# Altium footprint library 20210518.PcbLib: 414 footprints (part 13 of 26)
Each footprint in its own frame and in the unit in brackets; x right, y up, seen from the top. Pads: shape width x height; smd on the part's side, far side on the other; paste and mask are expansions set on the pad; w line width, h text height; cw(c..) or ccw(c..) is an arc to the next point about the centre after c.
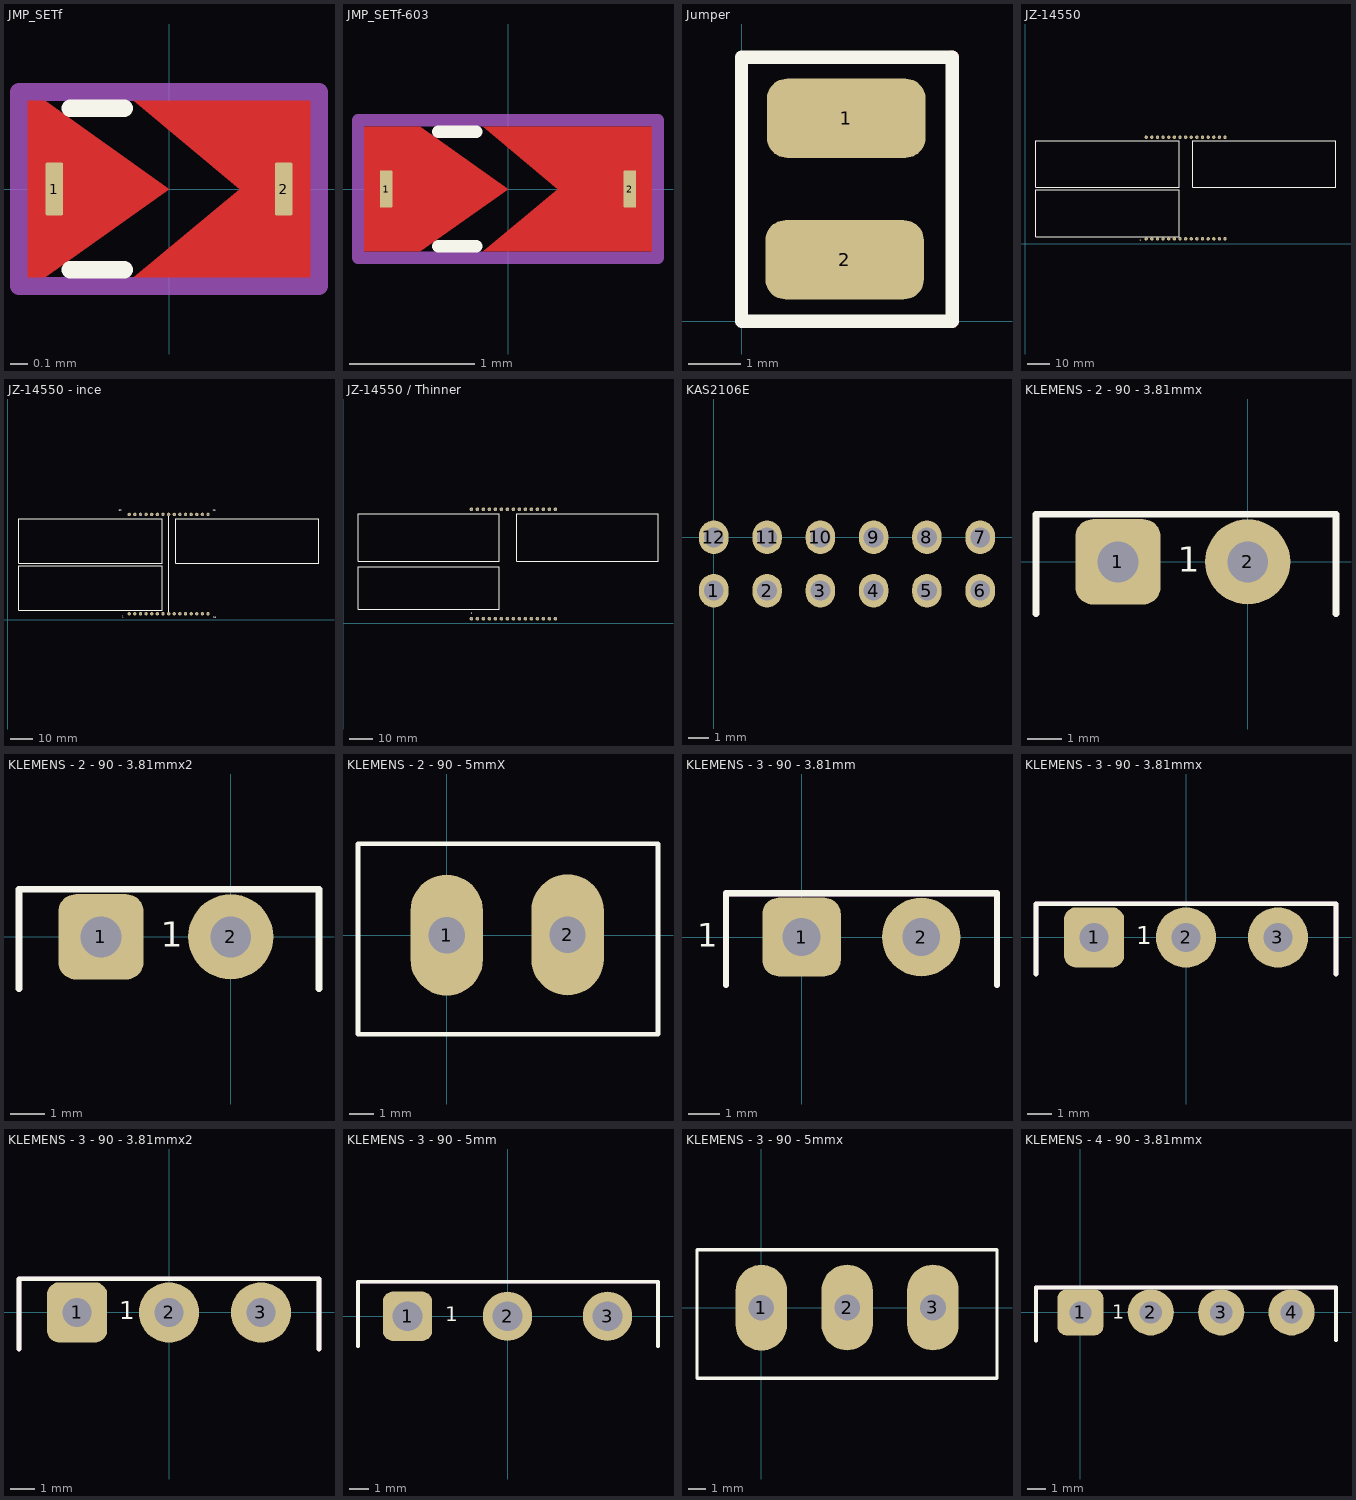
[diagram p12: the footprints below, top view; thin cyan lines are the x and y axes]

## JMP_SETf [mm] "Jumper 2pin; setting jumper"
pads (2):
  rrect20% 0.1x0.3 smd: 1(-0.65,0) 2(0.65,0)
Top Layer:
  region: -0.8,0.5 -0.8,-0.5 -0.7,-0.5 0,0 -0.7,0.5
  region: -0.2,0.5 0.8,0.5 0.8,-0.5 -0.2,-0.5 0.4,0
Top Overlay:
  lines w0.1: -0.559,-0.457 -0.254,-0.457 ; -0.559,0.457 -0.254,0.457
Top Solder:
  region: -0.2,0.5 0.8,0.5 0.8,-0.5 -0.2,-0.5 0.4,0
  region: -0.8,0.5 -0.8,-0.5 -0.7,-0.5 0,0 -0.7,0.5
Mechanical 13:
  lines w0.1: -0.85,-0.55 0.85,-0.55 0.85,0.55 -0.85,0.55 -0.85,-0.55
Mechanical 15:
  lines w0.1: -0.85,-0.55 0.85,-0.55 0.85,0.55 -0.85,0.55 -0.85,-0.55

## JMP_SETf-603 [mm] "Jumper 2pin; setting jumper"
pads (2):
  rrect20% 0.1x0.3 smd: 1(-0.975,0) 2(0.975,0)
Top Layer:
  region: -1.15,0.5 -1.15,-0.5 -0.7,-0.5 0,0 -0.7,0.5
  region: -0.2,0.5 1.15,0.5 1.15,-0.5 -0.2,-0.5 0.4,0
Top Overlay:
  lines w0.1: -0.559,-0.457 -0.254,-0.457 ; -0.559,0.457 -0.254,0.457
Top Solder:
  region: -0.2,0.5 1.15,0.5 1.15,-0.5 -0.2,-0.5 0.4,0
  region: -1.15,0.5 -1.15,-0.5 -0.7,-0.5 0,0 -0.7,0.5
Mechanical 13:
  lines w0.1: -1.2,-0.55 1.2,-0.55 1.2,0.55 -1.2,0.55 -1.2,-0.55
Mechanical 15:
  lines w0.1: -1.2,-0.55 1.194,-0.55 1.194,0.55 -1.2,0.55 -1.2,-0.55

## Jumper [mm]
pads (2):
  rrect50% 3x1.5 smd: 1(1.981,3.844) 2(1.951,1.163)
Top Layer:
  lines w0.254: 3.988,0.001 3.99,0.003 ; 3.99,4.998 3.992,5
Top Overlay:
  lines w0.254: -0.002,0.014 -0.002,5.001 ; 0,0.001 3.988,0.001 ; 0.017,5 3.992,5 ; 3.99,0.003 3.99,4.998

## JZ-14550 [mm]
pads (30):
  round 1.524 hole 0.8: 1(54.5,2.25) 2(57.04,2.25) 3(59.58,2.25) 4(62.12,2.25) 5(64.66,2.25) 6(67.2,2.25) 7(69.74,2.25) 8(72.28,2.25) 9(74.82,2.25) 10(77.36,2.25) 11(79.9,2.25) 12(82.44,2.25) 13(84.98,2.25) 14(87.52,2.25) 15(90.06,2.25) 16(90.06,48.05) 17(87.52,48.05) 18(84.98,48.05) 19(82.44,48.05) 20(79.9,48.05) 21(77.36,48.05) 22(74.82,48.05) 23(72.28,48.05) 24(69.74,48.05) 25(67.2,48.05) 26(64.66,48.05) 27(62.12,48.05) 28(59.58,48.05) 29(57.04,48.05) 30(54.5,48.05)
Top Overlay:
  lines w0.254: 4.8,3.2 69.5,3.2 69.5,24.3 4.8,24.3 4.8,3.2 ; 4.8,25.45 4.8,46.5 69.5,46.5 69.5,25.45 4.8,25.45 ; 75.4,25.4 140.1,25.4 140.1,46.5 75.4,46.5 75.4,25.4
  text "1" at 51.65,0.6 h1.52
3D body: height 17.01, standoff 17, extent 7.65,21.75 16.65,22.75
3D body: height 17.01, standoff 17, extent 15.65,13.75 16.65,22.75
3D body: height 17.01, standoff 17, extent 7.65,13.75 16.65,14.75
3D body: height 17.01, standoff 17, extent 7.65,13.75 8.65,22.75
3D body: height 17.01, standoff 17, extent 7.65,12.75 16.65,13.75
3D body: height 17.01, standoff 17, extent 15.65,4.75 16.65,13.75
3D body: height 17.01, standoff 17, extent 7.65,4.75 16.65,5.75
3D body: height 17.01, standoff 17, extent 7.65,4.75 8.65,13.75
3D body: height 17.01, standoff 17, extent 17.65,4.75 18.65,13.75
3D body: height 17.01, standoff 17, extent 17.65,4.75 26.65,5.75
3D body: height 17.01, standoff 17, extent 25.65,4.75 26.65,13.75
3D body: height 17.01, standoff 17, extent 17.65,12.75 26.65,13.75
3D body: height 17.01, standoff 17, extent 17.65,13.75 18.65,22.75
3D body: height 17.01, standoff 17, extent 17.65,13.75 26.65,14.75
3D body: height 17.01, standoff 17, extent 25.65,13.75 26.65,22.75
3D body: height 17.01, standoff 17, extent 17.65,21.75 26.65,22.75
3D body: height 17.01, standoff 17, extent 27.65,4.75 28.65,13.75
3D body: height 17.01, standoff 17, extent 27.65,4.75 36.65,5.75
3D body: height 17.01, standoff 17, extent 35.65,4.75 36.65,13.75
3D body: height 17.01, standoff 17, extent 27.65,12.75 36.65,13.75
3D body: height 17.01, standoff 17, extent 27.65,13.75 28.65,22.75
3D body: height 17.01, standoff 17, extent 27.65,13.75 36.65,14.75
3D body: height 17.01, standoff 17, extent 35.65,13.75 36.65,22.75
3D body: height 17.01, standoff 17, extent 27.65,21.75 36.65,22.75
3D body: height 17.01, standoff 17, extent 37.65,4.75 38.65,13.75
3D body: height 17.01, standoff 17, extent 37.65,4.75 46.65,5.75
3D body: height 17.01, standoff 17, extent 45.65,4.75 46.65,13.75
3D body: height 17.01, standoff 17, extent 37.65,12.75 46.65,13.75
3D body: height 17.01, standoff 17, extent 37.65,13.75 38.65,22.75
3D body: height 17.01, standoff 17, extent 37.65,13.75 46.65,14.75
3D body: height 17.01, standoff 17, extent 45.65,13.75 46.65,22.75
3D body: height 17.01, standoff 17, extent 37.65,21.75 46.65,22.75
3D body: height 17.01, standoff 17, extent 47.65,4.75 48.65,13.75
3D body: height 17.01, standoff 17, extent 47.65,4.75 56.65,5.75
3D body: height 17.01, standoff 17, extent 55.65,4.75 56.65,13.75
3D body: height 17.01, standoff 17, extent 47.65,12.75 56.65,13.75
3D body: height 17.01, standoff 17, extent 47.65,13.75 48.65,22.75
3D body: height 17.01, standoff 17, extent 47.65,13.75 56.65,14.75
3D body: height 17.01, standoff 17, extent 55.65,13.75 56.65,22.75
3D body: height 17.01, standoff 17, extent 47.65,21.75 56.65,22.75
3D body: height 17.01, standoff 17, extent 57.65,4.75 58.65,13.75
3D body: height 17.01, standoff 17, extent 57.65,4.75 66.65,5.75
3D body: height 17.01, standoff 17, extent 65.65,4.75 66.65,13.75
3D body: height 17.01, standoff 17, extent 57.65,12.75 66.65,13.75
3D body: height 17.01, standoff 17, extent 57.65,13.75 58.65,22.75
3D body: height 17.01, standoff 17, extent 57.65,13.75 66.65,14.75
3D body: height 17.01, standoff 17, extent 65.65,13.75 66.65,22.75
3D body: height 17.01, standoff 17, extent 57.65,21.75 66.65,22.75
3D body: height 17.01, standoff 17, extent 78.25,43.95 87.25,44.95
3D body: height 17.01, standoff 17, extent 86.25,35.95 87.25,44.95
3D body: height 17.01, standoff 17, extent 78.25,35.95 87.25,36.95
3D body: height 17.01, standoff 17, extent 78.25,35.95 79.25,44.95
3D body: height 17.01, standoff 17, extent 78.25,34.95 87.25,35.95
3D body: height 17.01, standoff 17, extent 86.25,26.95 87.25,35.95
3D body: height 17.01, standoff 17, extent 78.25,26.95 87.25,27.95
3D body: height 17.01, standoff 17, extent 78.25,26.95 79.25,35.95
3D body: height 17.01, standoff 17, extent 88.25,26.95 89.25,35.95
3D body: height 17.01, standoff 17, extent 88.25,26.95 97.25,27.95
3D body: height 17.01, standoff 17, extent 96.25,26.95 97.25,35.95
3D body: height 17.01, standoff 17, extent 88.25,34.95 97.25,35.95
3D body: height 17.01, standoff 17, extent 88.25,35.95 89.25,44.95
3D body: height 17.01, standoff 17, extent 88.25,35.95 97.25,36.95
3D body: height 17.01, standoff 17, extent 96.25,35.95 97.25,44.95
3D body: height 17.01, standoff 17, extent 88.25,43.95 97.25,44.95
3D body: height 17.01, standoff 17, extent 98.25,26.95 99.25,35.95
3D body: height 17.01, standoff 17, extent 98.25,26.95 107.25,27.95
3D body: height 17.01, standoff 17, extent 106.25,26.95 107.25,35.95
3D body: height 17.01, standoff 17, extent 98.25,34.95 107.25,35.95
3D body: height 17.01, standoff 17, extent 98.25,35.95 99.25,44.95
3D body: height 17.01, standoff 17, extent 98.25,35.95 107.25,36.95
3D body: height 17.01, standoff 17, extent 106.25,35.95 107.25,44.95
3D body: height 17.01, standoff 17, extent 98.25,43.95 107.25,44.95
3D body: height 17.01, standoff 17, extent 108.25,26.95 109.25,35.95
3D body: height 17.01, standoff 17, extent 108.25,26.95 117.25,27.95
3D body: height 17.01, standoff 17, extent 116.25,26.95 117.25,35.95
3D body: height 17.01, standoff 17, extent 108.25,34.95 117.25,35.95
3D body: height 17.01, standoff 17, extent 108.25,35.95 109.25,44.95
3D body: height 17.01, standoff 17, extent 108.25,35.95 117.25,36.95
3D body: height 17.01, standoff 17, extent 116.25,35.95 117.25,44.95
3D body: height 17.01, standoff 17, extent 108.25,43.95 117.25,44.95
3D body: height 17.01, standoff 17, extent 118.25,26.95 119.25,35.95
3D body: height 17.01, standoff 17, extent 118.25,26.95 127.25,27.95
3D body: height 17.01, standoff 17, extent 126.25,26.95 127.25,35.95
3D body: height 17.01, standoff 17, extent 118.25,34.95 127.25,35.95
3D body: height 17.01, standoff 17, extent 118.25,35.95 119.25,44.95
3D body: height 17.01, standoff 17, extent 118.25,35.95 127.25,36.95
3D body: height 17.01, standoff 17, extent 126.25,35.95 127.25,44.95
3D body: height 17.01, standoff 17, extent 118.25,43.95 127.25,44.95
3D body: height 17.01, standoff 17, extent 128.25,26.95 129.25,35.95
3D body: height 17.01, standoff 17, extent 128.25,26.95 137.25,27.95
3D body: height 17.01, standoff 17, extent 136.25,26.95 137.25,35.95
3D body: height 17.01, standoff 17, extent 128.25,34.95 137.25,35.95
3D body: height 17.01, standoff 17, extent 128.25,35.95 129.25,44.95
3D body: height 17.01, standoff 17, extent 128.25,35.95 137.25,36.95
3D body: height 17.01, standoff 17, extent 136.25,35.95 137.25,44.95
3D body: height 17.01, standoff 17, extent 128.25,43.95 137.25,44.95
3D body: height 17.01, standoff 17, extent 57.65,43.95 66.65,44.95
3D body: height 17.01, standoff 17, extent 65.65,35.95 66.65,44.95
3D body: height 17.01, standoff 17, extent 57.65,35.95 66.65,36.95
3D body: height 17.01, standoff 17, extent 57.65,35.95 58.65,44.95
3D body: height 17.01, standoff 17, extent 57.65,34.95 66.65,35.95
3D body: height 17.01, standoff 17, extent 65.65,26.95 66.65,35.95
3D body: height 17.01, standoff 17, extent 57.65,26.95 66.65,27.95
3D body: height 17.01, standoff 17, extent 57.65,26.95 58.65,35.95
3D body: height 17.01, standoff 17, extent 47.65,43.95 56.65,44.95
3D body: height 17.01, standoff 17, extent 55.65,35.95 56.65,44.95
3D body: height 17.01, standoff 17, extent 47.65,35.95 56.65,36.95
3D body: height 17.01, standoff 17, extent 47.65,35.95 48.65,44.95
3D body: height 17.01, standoff 17, extent 47.65,34.95 56.65,35.95
3D body: height 17.01, standoff 17, extent 55.65,26.95 56.65,35.95
3D body: height 17.01, standoff 17, extent 47.65,26.95 56.65,27.95
3D body: height 17.01, standoff 17, extent 47.65,26.95 48.65,35.95
3D body: height 17.01, standoff 17, extent 37.65,43.95 46.65,44.95
3D body: height 17.01, standoff 17, extent 45.65,35.95 46.65,44.95
3D body: height 17.01, standoff 17, extent 37.65,35.95 46.65,36.95
3D body: height 17.01, standoff 17, extent 37.65,35.95 38.65,44.95
3D body: height 17.01, standoff 17, extent 37.65,34.95 46.65,35.95
3D body: height 17.01, standoff 17, extent 45.65,26.95 46.65,35.95
3D body: height 17.01, standoff 17, extent 37.65,26.95 46.65,27.95
3D body: height 17.01, standoff 17, extent 37.65,26.95 38.65,35.95
3D body: height 17.01, standoff 17, extent 27.65,43.95 36.65,44.95
3D body: height 17.01, standoff 17, extent 35.65,35.95 36.65,44.95
3D body: height 17.01, standoff 17, extent 27.65,35.95 36.65,36.95
3D body: height 17.01, standoff 17, extent 27.65,35.95 28.65,44.95
3D body: height 17.01, standoff 17, extent 27.65,34.95 36.65,35.95
3D body: height 17.01, standoff 17, extent 35.65,26.95 36.65,35.95
3D body: height 17.01, standoff 17, extent 27.65,26.95 36.65,27.95
3D body: height 17.01, standoff 17, extent 27.65,26.95 28.65,35.95
3D body: height 17.01, standoff 17, extent 17.65,43.95 26.65,44.95
3D body: height 17.01, standoff 17, extent 25.65,35.95 26.65,44.95
3D body: height 17.01, standoff 17, extent 17.65,35.95 26.65,36.95
3D body: height 17.01, standoff 17, extent 17.65,35.95 18.65,44.95
3D body: height 17.01, standoff 17, extent 17.65,34.95 26.65,35.95
3D body: height 17.01, standoff 17, extent 25.65,26.95 26.65,35.95
3D body: height 17.01, standoff 17, extent 17.65,26.95 26.65,27.95
3D body: height 17.01, standoff 17, extent 17.65,26.95 18.65,35.95
3D body: height 17.01, standoff 17, extent 7.65,26.95 8.65,35.95
3D body: height 17.01, standoff 17, extent 7.65,26.95 16.65,27.95
3D body: height 17.01, standoff 17, extent 15.65,26.95 16.65,35.95
3D body: height 17.01, standoff 17, extent 7.65,34.95 16.65,35.95
3D body: height 17.01, standoff 17, extent 7.65,35.95 8.65,44.95
3D body: height 17.01, standoff 17, extent 7.65,35.95 16.65,36.95
3D body: height 17.01, standoff 17, extent 15.65,35.95 16.65,44.95
3D body: height 2, standoff 0, extent 0,0 2.5,50
3D body: height 2, standoff 0, extent 142.5,0 145,50
3D body: height 17.01, standoff 17, extent 7.65,43.95 16.65,44.95
3D body: height 17, standoff 2, extent 0,0 145,50

## JZ-14550 - ince [mm]
pads (30):
  round 1.524 hole 0.8: 1(54.72,2.6) 2(57.26,2.6) 3(59.8,2.6) 4(62.34,2.6) 5(64.88,2.6) 6(67.42,2.6) 7(69.96,2.6) 8(72.5,2.6) 9(75.04,2.6) 10(77.58,2.6) 11(80.12,2.6) 12(82.66,2.6) 13(85.2,2.6) 14(87.74,2.6) 15(90.28,2.6) 16(90.28,47.4) 17(87.74,47.4) 18(85.2,47.4) 19(82.66,47.4) 20(80.12,47.4) 21(77.58,47.4) 22(75.04,47.4) 23(72.5,47.4) 24(69.96,47.4) 25(67.42,47.4) 26(64.88,47.4) 27(62.34,47.4) 28(59.8,47.4) 29(57.26,47.4) 30(54.72,47.4)
Top Overlay:
  lines w0.1: 72.5,2.6 72.5,47.4
  lines w0.254: 140.32,45.4 140.32,25.4 75.62,25.4 75.62,45.45 140.32,45.45 ; 5.02,4.25 5.02,24.3 69.72,24.3 69.72,4.25 5.02,4.25 ; 5.02,25.45 69.72,25.45 69.72,45.45 5.02,45.45 5.02,25.45
  text "1" at 51.57,0.25 h1.52
  text "15" at 92.67,0.15 h1.52
  text "16" at 92.42,48.3 h1.52
  text "30" at 49.97,48.4 h1.52
3D body: height 2, standoff 0, extent 141.25,0 145,3.75
3D body: height 2, standoff 0, extent 141.25,46.25 145,50
3D body: height 2, standoff 0, extent 0,46.25 3.75,50
3D body: height 2, standoff 0, extent 0,0 3.75,3.75
3D body: height 9.26, standoff 9.25, extent 7.87,43.95 16.87,44.95
3D body: height 9.26, standoff 9.25, extent 15.87,35.95 16.87,44.95
3D body: height 9.26, standoff 9.25, extent 7.87,35.95 16.87,36.95
3D body: height 9.26, standoff 9.25, extent 7.87,35.95 8.87,44.95
3D body: height 9.26, standoff 9.25, extent 7.87,34.95 16.87,35.95
3D body: height 9.26, standoff 9.25, extent 15.87,26.95 16.87,35.95
3D body: height 9.26, standoff 9.25, extent 7.87,26.95 16.87,27.95
3D body: height 9.26, standoff 9.25, extent 7.87,26.95 8.87,35.95
3D body: height 9.26, standoff 9.25, extent 17.87,26.95 18.87,35.95
3D body: height 9.26, standoff 9.25, extent 17.87,26.95 26.87,27.95
3D body: height 9.26, standoff 9.25, extent 25.87,26.95 26.87,35.95
3D body: height 9.26, standoff 9.25, extent 17.87,34.95 26.87,35.95
3D body: height 9.26, standoff 9.25, extent 17.87,35.95 18.87,44.95
3D body: height 9.26, standoff 9.25, extent 17.87,35.95 26.87,36.95
3D body: height 9.26, standoff 9.25, extent 25.87,35.95 26.87,44.95
3D body: height 9.26, standoff 9.25, extent 17.87,43.95 26.87,44.95
3D body: height 9.26, standoff 9.25, extent 27.87,26.95 28.87,35.95
3D body: height 9.26, standoff 9.25, extent 27.87,26.95 36.87,27.95
3D body: height 9.26, standoff 9.25, extent 35.87,26.95 36.87,35.95
3D body: height 9.26, standoff 9.25, extent 27.87,34.95 36.87,35.95
3D body: height 9.26, standoff 9.25, extent 27.87,35.95 28.87,44.95
3D body: height 9.26, standoff 9.25, extent 27.87,35.95 36.87,36.95
3D body: height 9.26, standoff 9.25, extent 35.87,35.95 36.87,44.95
3D body: height 9.26, standoff 9.25, extent 27.87,43.95 36.87,44.95
3D body: height 9.26, standoff 9.25, extent 37.87,26.95 38.87,35.95
3D body: height 9.26, standoff 9.25, extent 37.87,26.95 46.87,27.95
3D body: height 9.26, standoff 9.25, extent 45.87,26.95 46.87,35.95
3D body: height 9.26, standoff 9.25, extent 37.87,34.95 46.87,35.95
3D body: height 9.26, standoff 9.25, extent 37.87,35.95 38.87,44.95
3D body: height 9.26, standoff 9.25, extent 37.87,35.95 46.87,36.95
3D body: height 9.26, standoff 9.25, extent 45.87,35.95 46.87,44.95
3D body: height 9.26, standoff 9.25, extent 37.87,43.95 46.87,44.95
3D body: height 9.26, standoff 9.25, extent 47.87,26.95 48.87,35.95
3D body: height 9.26, standoff 9.25, extent 47.87,26.95 56.87,27.95
3D body: height 9.26, standoff 9.25, extent 55.87,26.95 56.87,35.95
3D body: height 9.26, standoff 9.25, extent 47.87,34.95 56.87,35.95
3D body: height 9.26, standoff 9.25, extent 47.87,35.95 48.87,44.95
3D body: height 9.26, standoff 9.25, extent 47.87,35.95 56.87,36.95
3D body: height 9.26, standoff 9.25, extent 55.87,35.95 56.87,44.95
3D body: height 9.26, standoff 9.25, extent 47.87,43.95 56.87,44.95
3D body: height 9.26, standoff 9.25, extent 57.87,26.95 58.87,35.95
3D body: height 9.26, standoff 9.25, extent 57.87,26.95 66.87,27.95
3D body: height 9.26, standoff 9.25, extent 65.87,26.95 66.87,35.95
3D body: height 9.26, standoff 9.25, extent 57.87,34.95 66.87,35.95
3D body: height 9.26, standoff 9.25, extent 57.87,35.95 58.87,44.95
3D body: height 9.26, standoff 9.25, extent 57.87,35.95 66.87,36.95
3D body: height 9.26, standoff 9.25, extent 65.87,35.95 66.87,44.95
3D body: height 9.26, standoff 9.25, extent 57.87,43.95 66.87,44.95
3D body: height 9.26, standoff 9.25, extent 128.47,43.95 137.47,44.95
3D body: height 9.26, standoff 9.25, extent 136.47,35.95 137.47,44.95
3D body: height 9.26, standoff 9.25, extent 128.47,35.95 137.47,36.95
3D body: height 9.26, standoff 9.25, extent 128.47,35.95 129.47,44.95
3D body: height 9.26, standoff 9.25, extent 128.47,34.95 137.47,35.95
3D body: height 9.26, standoff 9.25, extent 136.47,26.95 137.47,35.95
3D body: height 9.26, standoff 9.25, extent 128.47,26.95 137.47,27.95
3D body: height 9.26, standoff 9.25, extent 128.47,26.95 129.47,35.95
3D body: height 9.26, standoff 9.25, extent 118.47,43.95 127.47,44.95
3D body: height 9.26, standoff 9.25, extent 126.47,35.95 127.47,44.95
3D body: height 9.26, standoff 9.25, extent 118.47,35.95 127.47,36.95
3D body: height 9.26, standoff 9.25, extent 118.47,35.95 119.47,44.95
3D body: height 9.26, standoff 9.25, extent 118.47,34.95 127.47,35.95
3D body: height 9.26, standoff 9.25, extent 126.47,26.95 127.47,35.95
3D body: height 9.26, standoff 9.25, extent 118.47,26.95 127.47,27.95
3D body: height 9.26, standoff 9.25, extent 118.47,26.95 119.47,35.95
3D body: height 9.26, standoff 9.25, extent 108.47,43.95 117.47,44.95
3D body: height 9.26, standoff 9.25, extent 116.47,35.95 117.47,44.95
3D body: height 9.26, standoff 9.25, extent 108.47,35.95 117.47,36.95
3D body: height 9.26, standoff 9.25, extent 108.47,35.95 109.47,44.95
3D body: height 9.26, standoff 9.25, extent 108.47,34.95 117.47,35.95
3D body: height 9.26, standoff 9.25, extent 116.47,26.95 117.47,35.95
3D body: height 9.26, standoff 9.25, extent 108.47,26.95 117.47,27.95
3D body: height 9.26, standoff 9.25, extent 108.47,26.95 109.47,35.95
3D body: height 9.26, standoff 9.25, extent 98.47,43.95 107.47,44.95
3D body: height 9.26, standoff 9.25, extent 106.47,35.95 107.47,44.95
3D body: height 9.26, standoff 9.25, extent 98.47,35.95 107.47,36.95
3D body: height 9.26, standoff 9.25, extent 98.47,35.95 99.47,44.95
3D body: height 9.26, standoff 9.25, extent 98.47,34.95 107.47,35.95
3D body: height 9.26, standoff 9.25, extent 106.47,26.95 107.47,35.95
3D body: height 9.26, standoff 9.25, extent 98.47,26.95 107.47,27.95
3D body: height 9.26, standoff 9.25, extent 98.47,26.95 99.47,35.95
3D body: height 9.26, standoff 9.25, extent 88.47,43.95 97.47,44.95
3D body: height 9.26, standoff 9.25, extent 96.47,35.95 97.47,44.95
3D body: height 9.26, standoff 9.25, extent 88.47,35.95 97.47,36.95
3D body: height 9.26, standoff 9.25, extent 88.47,35.95 89.47,44.95
3D body: height 9.26, standoff 9.25, extent 88.47,34.95 97.47,35.95
3D body: height 9.26, standoff 9.25, extent 96.47,26.95 97.47,35.95
3D body: height 9.26, standoff 9.25, extent 88.47,26.95 97.47,27.95
3D body: height 9.26, standoff 9.25, extent 88.47,26.95 89.47,35.95
3D body: height 9.26, standoff 9.25, extent 78.47,26.95 79.47,35.95
3D body: height 9.26, standoff 9.25, extent 78.47,26.95 87.47,27.95
3D body: height 9.26, standoff 9.25, extent 86.47,26.95 87.47,35.95
3D body: height 9.26, standoff 9.25, extent 78.47,34.95 87.47,35.95
3D body: height 9.26, standoff 9.25, extent 78.47,35.95 79.47,44.95
3D body: height 9.26, standoff 9.25, extent 78.47,35.95 87.47,36.95
3D body: height 9.26, standoff 9.25, extent 86.47,35.95 87.47,44.95
3D body: height 9.26, standoff 9.25, extent 78.47,43.95 87.47,44.95
3D body: height 9.26, standoff 9.25, extent 57.87,21.75 66.87,22.75
3D body: height 9.26, standoff 9.25, extent 65.87,13.75 66.87,22.75
3D body: height 9.26, standoff 9.25, extent 57.87,13.75 66.87,14.75
3D body: height 9.26, standoff 9.25, extent 57.87,13.75 58.87,22.75
3D body: height 9.26, standoff 9.25, extent 57.87,12.75 66.87,13.75
3D body: height 9.26, standoff 9.25, extent 65.87,4.75 66.87,13.75
3D body: height 9.26, standoff 9.25, extent 57.87,4.75 66.87,5.75
3D body: height 9.26, standoff 9.25, extent 57.87,4.75 58.87,13.75
3D body: height 9.26, standoff 9.25, extent 47.87,21.75 56.87,22.75
3D body: height 9.26, standoff 9.25, extent 55.87,13.75 56.87,22.75
3D body: height 9.26, standoff 9.25, extent 47.87,13.75 56.87,14.75
3D body: height 9.26, standoff 9.25, extent 47.87,13.75 48.87,22.75
3D body: height 9.26, standoff 9.25, extent 47.87,12.75 56.87,13.75
3D body: height 9.26, standoff 9.25, extent 55.87,4.75 56.87,13.75
3D body: height 9.26, standoff 9.25, extent 47.87,4.75 56.87,5.75
3D body: height 9.26, standoff 9.25, extent 47.87,4.75 48.87,13.75
3D body: height 9.26, standoff 9.25, extent 37.87,21.75 46.87,22.75
3D body: height 9.26, standoff 9.25, extent 45.87,13.75 46.87,22.75
3D body: height 9.26, standoff 9.25, extent 37.87,13.75 46.87,14.75
3D body: height 9.26, standoff 9.25, extent 37.87,13.75 38.87,22.75
3D body: height 9.26, standoff 9.25, extent 37.87,12.75 46.87,13.75
3D body: height 9.26, standoff 9.25, extent 45.87,4.75 46.87,13.75
3D body: height 9.26, standoff 9.25, extent 37.87,4.75 46.87,5.75
3D body: height 9.26, standoff 9.25, extent 37.87,4.75 38.87,13.75
3D body: height 9.26, standoff 9.25, extent 27.87,21.75 36.87,22.75
3D body: height 9.26, standoff 9.25, extent 35.87,13.75 36.87,22.75
3D body: height 9.26, standoff 9.25, extent 27.87,13.75 36.87,14.75
3D body: height 9.26, standoff 9.25, extent 27.87,13.75 28.87,22.75
3D body: height 9.26, standoff 9.25, extent 27.87,12.75 36.87,13.75
3D body: height 9.26, standoff 9.25, extent 35.87,4.75 36.87,13.75
3D body: height 9.26, standoff 9.25, extent 27.87,4.75 36.87,5.75
3D body: height 9.26, standoff 9.25, extent 27.87,4.75 28.87,13.75
3D body: height 9.26, standoff 9.25, extent 17.87,21.75 26.87,22.75
3D body: height 9.26, standoff 9.25, extent 25.87,13.75 26.87,22.75
3D body: height 9.26, standoff 9.25, extent 17.87,13.75 26.87,14.75
3D body: height 9.26, standoff 9.25, extent 17.87,13.75 18.87,22.75
3D body: height 9.26, standoff 9.25, extent 17.87,12.75 26.87,13.75
3D body: height 9.26, standoff 9.25, extent 25.87,4.75 26.87,13.75
3D body: height 9.26, standoff 9.25, extent 17.87,4.75 26.87,5.75
3D body: height 9.26, standoff 9.25, extent 17.87,4.75 18.87,13.75
3D body: height 9.26, standoff 9.25, extent 7.87,4.75 8.87,13.75
3D body: height 9.26, standoff 9.25, extent 7.87,4.75 16.87,5.75
3D body: height 9.26, standoff 9.25, extent 15.87,4.75 16.87,13.75
3D body: height 9.26, standoff 9.25, extent 7.87,12.75 16.87,13.75
3D body: height 9.26, standoff 9.25, extent 7.87,13.75 8.87,22.75
3D body: height 9.26, standoff 9.25, extent 7.87,13.75 16.87,14.75
3D body: height 9.26, standoff 9.25, extent 15.87,13.75 16.87,22.75
3D body: height 9.26, standoff 9.25, extent 7.87,21.75 16.87,22.75
3D body: height 9.25, standoff 2, extent 0,0 145,50

## JZ-14550 / Thinner [mm] "Slim Case"
height 9
pads (30):
  round 1.524 hole 0.8: 1(54.5,2) 2(57.04,2) 3(59.58,2) 4(62.12,2) 5(64.66,2) 6(67.2,2) 7(69.74,2) 8(72.28,2) 9(74.82,2) 10(77.36,2) 11(79.9,2) 12(82.44,2) 13(84.98,2) 14(87.52,2) 15(90.06,2) 16(90.06,48.3) 17(87.52,48.3) 18(84.98,48.3) 19(82.44,48.3) 20(79.9,48.3) 21(77.36,48.3) 22(74.82,48.3) 23(72.28,48.3) 24(69.74,48.3) 25(67.2,48.3) 26(64.66,48.3) 27(62.12,48.3) 28(59.58,48.3) 29(57.04,48.3) 30(54.5,48.3)
Top Overlay:
  lines w0.254: 6.5,6 6.5,23.9 46.3,23.9 66.3,23.9 66.3,6 6.5,6 ; 6.5,26.4 6.5,46.4 66.3,46.4 66.3,26.4 26.5,26.4 6.5,26.4 ; 73.683,26.4 93.683,26.4 133.483,26.4 133.483,46.4 73.683,46.4 73.683,26.4
  text "1" at 54.2,3.4 h1.52
3D body: height 9.01, standoff 9, extent 6.604,26.416 66.167,46.355
3D body: height 9.01, standoff 9, extent 73.66,26.416 133.223,46.355
3D body: height 9.01, standoff 9, extent 6.477,3.937 66.04,23.876
3D body: height 2, standoff 0, extent 142.5,0 145,50
3D body: height 2, standoff 0, extent 0,0 2.5,50
3D body: height 9, standoff 2, extent 0,0 145,50

## KAS2106E [mm] "Dip Switch SPST 6 Position Through Hole, Right Angle Slide (Standard) Actuator 25mA 24VDC"
pads (12):
  oval 1.4x1.6 hole 0.95: 1(0,-2.54) 2(2.54,-2.54) 3(5.08,-2.54) 4(7.62,-2.54) 5(10.16,-2.54) 6(12.7,-2.54) 7(12.7,0) 8(10.16,0) 9(7.62,0) 10(5.08,0) 11(2.54,0) 12(0,0)
3D body: height 9.95, standoff -2.85, extent -1.9,-2.695 14.7,7.12

## KLEMENS - 2 - 90 - 3.81mmx [mm] "Connector; Header; 2 Position - 691322310002"
height 8.5
pads (2):
  rrect40% 2.5x2.5 hole 1.2: 1(-3.81,0)
  round 2.5 hole 1.2: 2(0,0)
Top Overlay:
  lines w0.2: -6.215,-1.524 -6.215,1.397 ; -6.198,1.397 2.59,1.397 2.59,-1.524
  text "1" at -2.057,-0.533 h1.27
3D body: height 7.2, standoff -3.5, extent -6.305,-8.02 2.505,1.18

## KLEMENS - 2 - 90 - 3.81mmx2 [mm] "Connector; Header; 2 Position - TBP02R1-381-02BE"
height 8.5
pads (2):
  rrect40% 2.5x2.5 hole 1.2: 1(-3.81,0)
  round 2.5 hole 1.2: 2(0,0)
Top Overlay:
  lines w0.2: -6.215,-1.524 -6.215,1.397 ; -6.198,1.397 2.59,1.397 2.59,-1.524
  text "1" at -2.057,-0.533 h1.27
3D body: height 7.7, standoff -3, extent -6.155,-8.03 2.255,1.17

## KLEMENS - 2 - 90 - 5mmX [mm] "90 Derece 2 Pin Yesil Klemens - 691313510002"
pads (2):
  oval 3x5 hole 1.5: 1(0,0)
  oval 3x5 hole 1.499: 2(5,0.012)
Top Overlay:
  lines w0.203: -3.67,-4.1 8.74,-4.1 8.74,3.78 -3.67,3.78 -3.67,-4.1
3D body: height 8.65, standoff -3.35, extent -3.53,-9.99 8.63,2.01

## KLEMENS - 3 - 90 - 3.81mm [mm] "Connector; Header; 2 Position"
height 8.5
pads (2):
  rrect40% 2.5x2.5 hole 1.2: 1(0,0)
  round 2.5 hole 1.2: 2(3.81,0)
Top Overlay:
  lines w0.2: -2.405,-1.524 -2.405,1.397 ; -2.388,1.397 6.223,1.397 6.223,-1.524
  text "1" at -3.327,-0.559 h1.27
Mechanical 13:
  lines w0.2: -2.405,-1.524 -2.405,1.397 ; -2.388,1.397 6.223,1.397 6.223,-1.499
Mechanical 15:
  lines w0.2: -2.405,-1.524 -2.405,1.397 ; -2.388,1.397 6.223,1.397 6.223,-1.524
3D body: height 16.2, standoff -3.6, extent -1.905,-7.045 5.715,1.255

## KLEMENS - 3 - 90 - 3.81mmx [mm] "Connector; Header; 3 Position - 691322310003"
height 8.5
pads (3):
  rrect40% 2.5x2.5 hole 1.2: 1(-3.81,0)
  round 2.5 hole 1.2: 2(0,0) 3(3.81,0)
Top Overlay:
  lines w0.2: -6.215,-1.524 -6.215,1.397 ; -6.198,1.397 6.198,1.397 ; 6.215,-1.524 6.215,1.397
  text "1" at -2.057,-0.533 h1.27
Mechanical 13:
  lines w0.2: -6.215,-1.524 -6.215,1.397 ; -6.198,1.397 6.198,1.397 ; 6.215,-1.524 6.215,1.397
Mechanical 15:
  lines w0.2: -6.215,-1.524 -6.215,1.397 ; -6.198,1.397 6.198,1.397 ; 6.215,-1.524 6.215,1.397
3D body: height 7, standoff -3.5, extent -6.359,-8.971 6.461,1.829

## KLEMENS - 3 - 90 - 3.81mmx2 [mm] "Connector; Header; 3 Position - TBP02R1-381-03BE"
height 8.5
pads (3):
  rrect40% 2.5x2.5 hole 1.2: 1(-3.81,0)
  round 2.5 hole 1.2: 2(0,0) 3(3.81,0)
Top Overlay:
  lines w0.2: -6.215,-1.524 -6.215,1.397 ; -6.198,1.397 6.198,1.397 ; 6.215,-1.524 6.215,1.397
  text "1" at -2.057,-0.533 h1.27
Mechanical 13:
  lines w0.2: -6.215,-1.524 -6.215,1.397 ; -6.198,1.397 6.198,1.397 ; 6.215,-1.524 6.215,1.397
Mechanical 15:
  lines w0.2: -6.215,-1.524 -6.215,1.397 ; -6.198,1.397 6.198,1.397 ; 6.215,-1.524 6.215,1.397
3D body: height 7.7, standoff -3, extent -6.03,-7.84 6.19,1.36

## KLEMENS - 3 - 90 - 5mm [mm] "Connector; Header; 3 Position"
height 8.5
pads (3):
  rrect40% 2.5x2.5 hole 1.5: 1(-5.08,0)
  round 2.5 hole 1.5: 2(0,0) 3(5.08,0)
Top Overlay:
  lines w0.2: -7.595,-1.524 -7.595,1.753 7.645,1.753 7.645,-1.524
  text "1" at -3.175,-0.508 h1.27
Mechanical 13:
  lines w0.2: -7.595,-1.524 -7.595,1.753 7.645,1.753 7.645,-1.524
Mechanical 15:
  lines w0.2: -7.595,-1.524 -7.595,1.753 7.645,1.753 7.645,-1.524
3D body: height 31.5, standoff -5, extent -7.595,-9.497 7.645,1.753

## KLEMENS - 3 - 90 - 5mmx [mm] "90 Derece 3 Pin Yesil Klemens - 691313510003"
pads (3):
  oval 3x5 hole 1.5: 1(0,0) 2(5,0.012) 3(10,0.015)
Top Overlay:
  lines w0.203: -3.75,-4.1 -3.75,3.37 13.73,3.37 13.73,-4.1 -3.75,-4.1
3D body: height 8.65, standoff -3.35, extent -3.62,-10.04 13.62,1.96

## KLEMENS - 4 - 90 - 3.81mmx [mm] "Connector; Header; 4 Position"
height 8.5
pads (4):
  rrect40% 2.5x2.5 hole 1.2: 1(0,0)
  round 2.5 hole 1.2: 2(3.81,0) 3(7.62,0) 4(11.43,0)
Top Overlay:
  lines w0.2: -2.405,-1.524 -2.405,1.346 ; -2.388,1.346 13.818,1.346 ; 13.835,-1.499 13.835,1.346
  text "1" at 1.727,-0.584 h1.27
Mechanical 13:
  lines w0.2: -2.405,-1.524 -2.405,1.346 ; -2.388,1.346 13.818,1.346 ; 13.835,-1.499 13.835,1.346
Mechanical 15:
  lines w0.2: -2.405,-1.524 -2.405,1.346 ; -2.388,1.346 13.818,1.346 ; 13.835,-1.499 13.835,1.346
3D body: height 7.2, standoff -3.5, extent -2.28,-7.99 13.75,1.21